# Altium integrated library Components_Robots.IntLib: 54 symbols
Pins are listed as number, name and electrical type; pins without a type are passive.

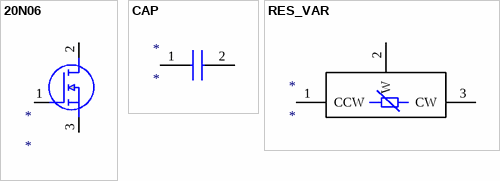
[diagram p0: symbols 20N06 to RES_VAR]

## 20N06
designator *
NMOSFET-20N06
footprint 20N06
pins: 1 G, 2 D, 3 S

## CAP
designator *
К10-17Б
footprint К10-17Б
pins: 1, 2

## RES_VAR
designator *
3296W
footprint 3296W
pins: 1 CCW, 2 W, 3 CW


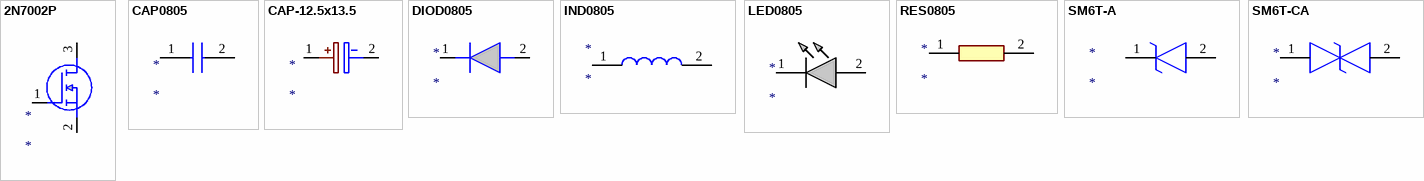
[diagram p1: symbols 2N7002P to SM6T-CA]

## 2N7002P
designator *
2N7002P,215
footprint 2N7002P
pins: 1 G, 2 S, 3 D

## CAP0805
designator *
CAP-SMD0805
footprint CAP0805
pins: 1, 2

## CAP-12.5x13.5
designator *
YUQINGXIN
footprint CAP-12.5x13.5
pins: 1 +, 2 -

## DIOD0805
designator *
1N4448WS-7-F
footprint DIOD0805
pins: 1 K, 2 A

## IND0805
designator *
LQM21FN
footprint IND0805
pins: 1, 2

## LED0805
designator *
LED-SMD0805
footprint LED0805
pins: 1 K, 2 A

## RES0805
designator *
RES-SMD0805
footprint RES0805
pins: 1, 2

## SM6T-A
designator *
SM6T12A-SMD
footprint SM6T-A
pins: 1, 2

## SM6T-CA
designator *
SM6T12CA-SMD
footprint SM6T-CA
pins: 1, 2


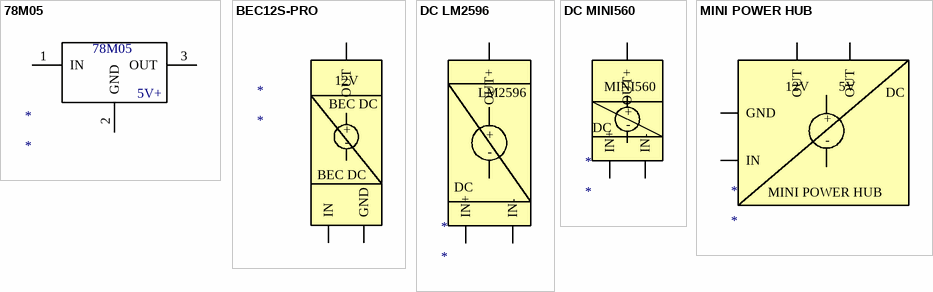
[diagram p2: symbols 78M05 to MINI POWER HUB]

## 78M05
designator *
78M05 +5V
footprint 78M05
pins: 1 IN, 2 GND, 3 OUT
text: 5V+

## BEC12S-PRO
designator *
DC-DC BEC12S-PRO
footprint BEC12S-PRO
pins: 1 IN (power), 2 GND (power), 3 OUT (power)
text: 12V; BEC DC; +; -

## DC LM2596
designator *
LM2596 DC-DC
footprint DC LM2596
pins: 1 IN+ (power), 2 IN- (power), 3 OUT+ (power)
text: LM2596; +; -; DC

## DC MINI560
designator *
MINI560 PRO DC-DC
footprint MINI560
pins: 1 IN+ (power), 2 IN- (power), 3 OUT+ (power)
text: MINI560; +; DC; -

## MINI POWER HUB
designator *
DC-DC MINU POWER HUB BEC 5V & 12V
footprint MINI POWER HUB
pins: 1 IN (power), 2 GND (power), 3 OUT (power), 4 OUT (power)
text: 12V; 5V; DC; +; -


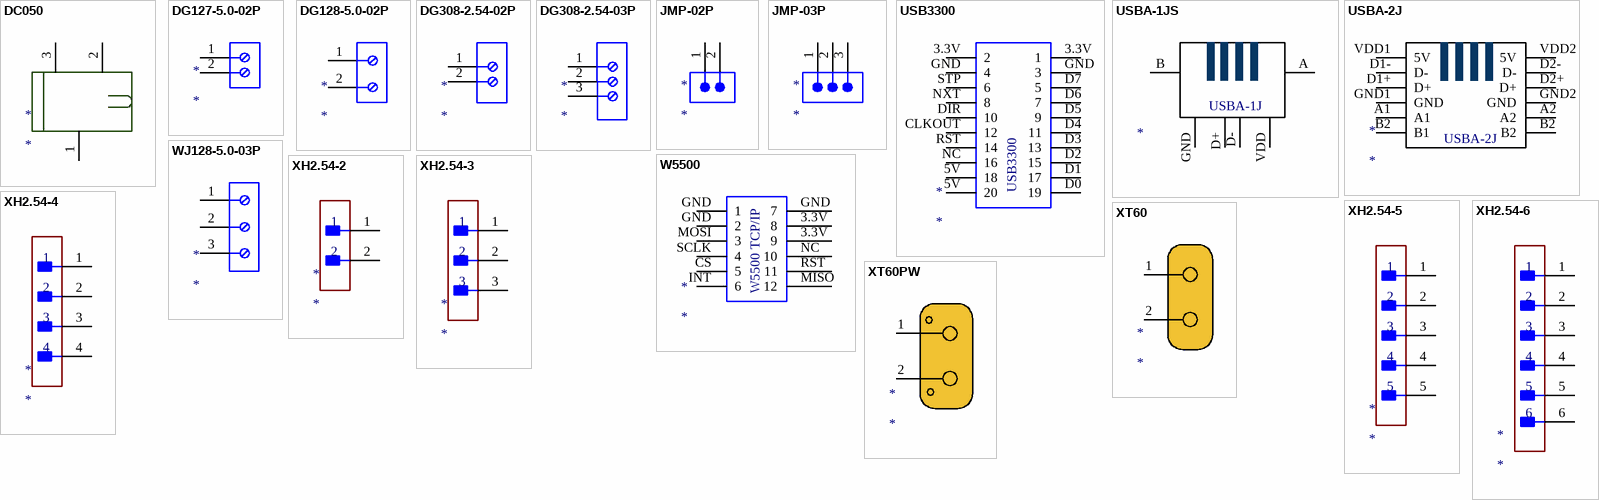
[diagram p3: symbols DC050 to XT60PW]

## DC050
designator *
DC050-T
footprint DC050
pins: 1, 2, 3

## DG127-5.0-02P
designator *
DG127-5.0-02P-14-00Z
footprint DG127-5.0-02P
pins: 1, 2

## DG128-5.0-02P
designator *
DG128-5.0-02P-14
footprint DG128-5.0-02P
pins: 1, 2

## DG308-2.54-02P
designator *
DG308-2.54-02P-14-00AH
footprint DG308-2.54-02P
pins: 1, 2

## DG308-2.54-03P
designator *
DG308-2.54-03P-14-00AH
footprint DG308-2.54-03P
pins: 1, 2, 3

## JMP-02P
designator *
PLS-1x2
footprint JMP-02P
pins: 1, 2

## JMP-03P
designator *
PLS-1x3
footprint JMP-03P
pins: 1, 2, 3

## USB3300
designator *
USB3300HS
footprint USB3300
pins: 3.3V 2, 3.3V 1, 5V 20, 5V 18, CLKOUT 12, D0 19, D1 17, D2 15, D3 13, D4 11, D5 9, D6 7, D7 5, DIR 10, GND 4, GND 3, NC 16, NXT 8, RST 14, STP 6

## USBA-1JS
designator *
DS1095-10
footprint USBA-1JS
pins: A, B MH2, D+ 3, D- 2, GND 4, VDD 1
text: USBA-1J

## USBA-2J
designator *
DS1096 W
footprint USBA-2J
pins: A1, A2, B2 B1, B2, D1+ D+, D1- D-, D2+ D+, D2- D-, GND1 GND, GND2 GND, VDD1 5V, VDD2 5V

## W5500
designator *
W5500 TCP/IP
footprint W5500
pins: 3.3V 8, 3.3V 9, CS 5, GND 1, GND 2, GND 7, INT 6, MISO 12, MOSI 3, NC 10, RST 11, SCLK 4

## WJ128-5.0-03P
designator *
WJ128-5.0-03P-14-00A
footprint WJ128-5.0-03P
pins: 1, 2, 3

## XH2.54-2
designator *
JST XH2.54-2pin
footprint XH2.54-2
pins: 1, 2

## XH2.54-3
designator *
JST XH2.54-3pin
footprint XH2.54-3
pins: 1, 2, 3

## XH2.54-4
designator *
JST XH2.54-4pin
footprint XH2.54-4
pins: 1, 2, 3, 4

## XH2.54-5
designator *
JST XH2.54-5pin
footprint XH2.54-5
pins: 1, 2, 3, 4, 5

## XH2.54-6
designator *
JST XH2.54-5pin
footprint XH2.54-6
pins: 1, 2, 3, 4, 5, 6

## XT60
designator *
XT60U-F
footprint XT60
pins: 1 4, 2 5

## XT60PW
designator *
XT60PW-F
footprint XT60PW
pins: 1 4, 2 5


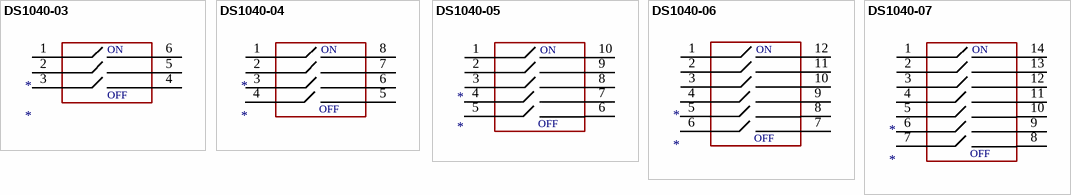
[diagram p4: symbols DS1040-03 to DS1040-07]

## DS1040-03
designator *
DS1040-03RN
footprint DS1040-03
pins: 1 COM_1, 2 COM_2, 3 COM_3, 4 NO_2, 5 NO_3, 6 NO_4
text: ON; OFF

## DS1040-04
designator *
DS1040-04RN
footprint DS1040-04
pins: 1 COM_1, 2 COM_2, 3 COM_3, 4 COM_3, 5 NO_2, 6 NO_2, 7 NO_3, 8 NO_4
text: ON; OFF

## DS1040-05
designator *
DS1040-05RN
footprint DS1040-05
pins: 1 COM_1, 2 COM_2, 3 COM_3, 4 COM_3, 5 COM_3, 6 NO_2, 7 NO_2, 8 NO_2, 9 NO_3, 10 NO_4
text: ON; OFF

## DS1040-06
designator *
DS1040-06RN
footprint DS1040-06
pins: 1 COM_1, 2 COM_2, 3 COM_3, 4 COM_3, 5 COM_3, 6 COM_3, 7 NO_2, 8 NO_2, 9 NO_2, 10 NO_2, 11 NO_3, 12 NO_4
text: ON; OFF

## DS1040-07
designator *
DS1040-07RN
footprint DS1040-07
pins: 1 COM_1, 2 COM_2, 3 COM_3, 4 COM_3, 5 COM_3, 6 COM_3, 7 COM_3, 8 NO_2, 9 NO_2, 10 NO_2, 11 NO_2, 12 NO_2, 13 NO_3, 14 NO_4
text: ON; OFF


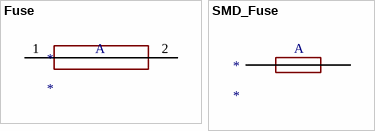
[diagram p5: symbols Fuse to SMD_Fuse]

## Fuse
designator *
KLS5-242 & BLX-A & BF-013
footprint Fuse
pins: 1, 2
text: A

## SMD_Fuse
designator *
01550900M
footprint SMD_Fuse
pins: 1, 2
text: A


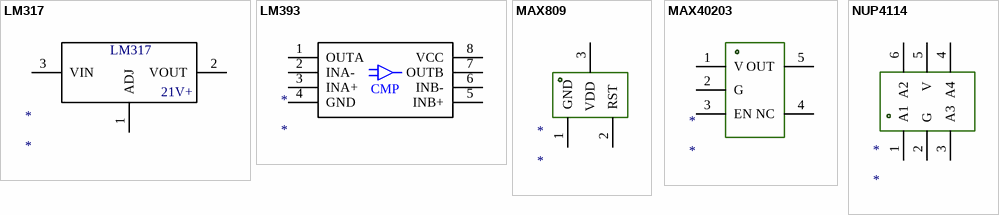
[diagram p6: symbols LM317 to NUP4114]

## LM317
designator *
LM317AEMP
footprint LM317
pins: 1 ADJ, 2 VOUT, 3 VIN
text: 21V+

## LM393
designator *
LM393ADR
footprint LM393ADR
pins: 1 OUTA, 2 INA-, 3 INA+, 4 GND, 5 INB+, 6 INB-, 7 OUTB, 8 VCC
text: CMP

## MAX809
designator *
MAX809R
footprint MAX809R
pins: 1 GND, 2 RST, 3 VDD

## MAX40203
designator *
MAX40203AUK+T
footprint MAX40203
pins: 1 V, 2 G, 3 EN, 4 NC, 5 OUT

## NUP4114
designator *
NUP4114HMR6T1G
footprint NUP4114
pins: 1 A1, 2 G, 3 A3, 4 A4, 5 V, 6 A2


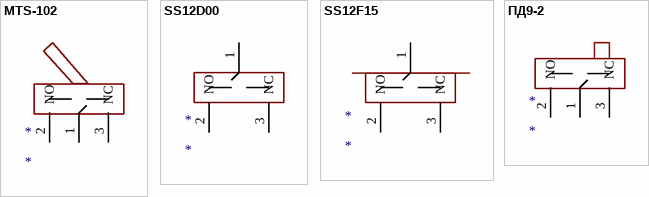
[diagram p7: symbols MTS-102 to ПД9-2]

## MTS-102
designator *
MTS-102-A1
footprint MTS-102
pins: 1 COM, 2 NO, 3 NC

## SS12D00
designator *
SS-12D00-G4
footprint SS12D00
pins: 1 COM, 2 NO, 3 NC

## SS12F15
designator *
SS12F15L5
footprint SS12F15
pins: 1 COM, 2 NO, 3 NC

## ПД9-2
designator *
ПД9-2
footprint ПД9-2
pins: 1 COM, 2 NO, 3 NC


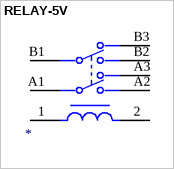
[diagram p8: symbol RELAY-5V]

## RELAY-5V
designator ?
R2G2CH005
footprint RELAY-5V
pins: 1 A1, 2 A2, A1 11, A2 14, A3 12, B1 21, B2 24, B3 22


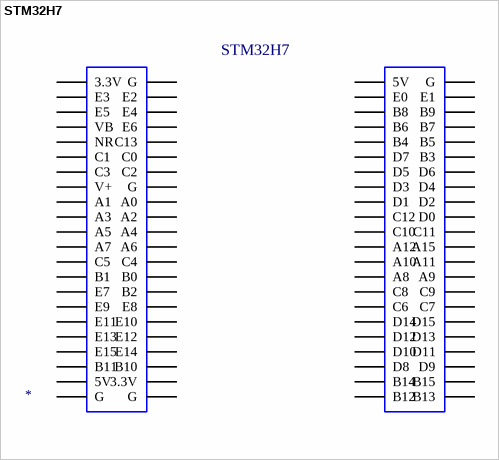
[diagram p9: symbol STM32H7]

## STM32H7
designator *
STM32H723VGT6
footprint STM32H7
pins: 3.3V, 3.3V, 5V, 5V, A0, A1, A2, A3, A4, A5, A6, A7, A8, A9, A10, A11, A12, A15, B0, B1, B2, B3, B4, B5, B6, B7, B8, B9, B10, B11, B12, B13, B14, B15, C0, C1, C2, C3, C4, C5, C6, C7, C8, C9, C10, C11, C12, C13, D0, D1, D2, D3, D4, D5, D6, D7, D8, D9, D10, D11, D12, D13, D14, D15, E0, E1, E2, E3, E4, E5, E6, E7, E8, E9, E10, E11, E12, E13, E14, E15, G, G, G, G, G, NR, V+, VB